# Altium footprint library myPcb.PcbLib: 145 footprints (part 4 of 10)
Each footprint in its own frame and in the unit in brackets; x right, y up, seen from the top. Pads: shape width x height; smd on the part's side, far side on the other; paste and mask are expansions set on the pad; w line width, h text height; cw(c..) or ccw(c..) is an arc to the next point about the centre after c.
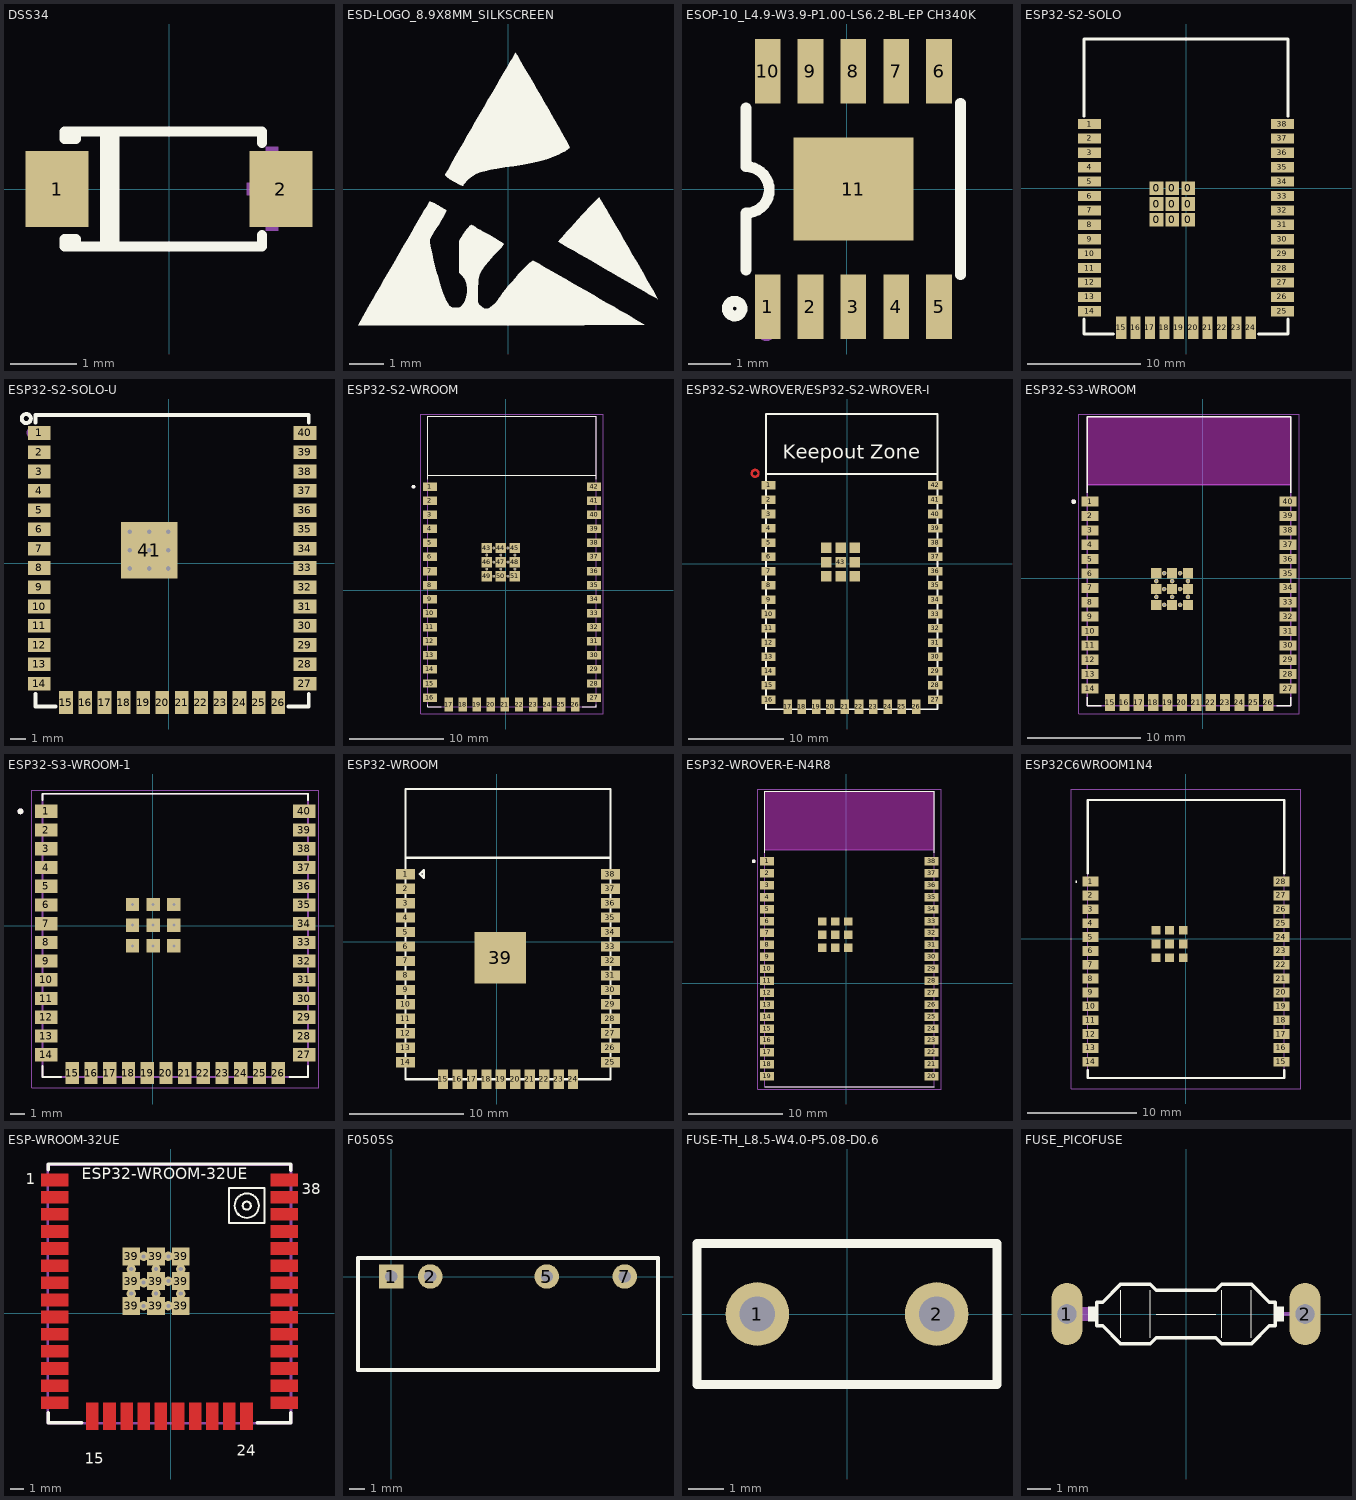
[diagram p3: the footprints below, top view; thin cyan lines are the x and y axes]

## DSS34 [mm]
pads (2):
  rect 0.95x1.15 smd paste+0 mask+0.051: 1(-1.693,0) 2(1.693,0)
Top Overlay:
  lines w0.152: -0.97,-0.866 -0.97,0.866 ; -0.827,-0.866 -0.827,0.866 ; 1.406,-0.698 1.406,-0.866 -1.406,-0.866 ; 1.406,0.698 1.406,0.866 -1.406,0.866 ; -1.406,-0.866 -1.58,-0.866 -1.58,-0.755 -1.406,-0.755 -1.406,-0.866 ; -1.406,0.866 -1.58,0.866 -1.58,0.755 -1.406,0.755 -1.406,0.866
Mechanical 15:
  region: -2.03,0.095 -2.03,-0.095 -1.272,-0.095 -1.272,0.095
  region: 1.935,0.098 1.935,-0.092 1.177,-0.092 1.177,0.098
  region: 1.651,0.635 1.651,-0.629 1.461,-0.629 1.461,0.635

## ESD-LOGO_8.9X8MM_SILKSCREEN [mm]
Top Overlay:
  drawing of 3 lines, arcs and shapes, not listed

## ESOP-10_L4.9-W3.9-P1.00-LS6.2-BL-EP CH340K [mm] "CH340K"
pads (11):
  rect 0.6x1.5 smd paste+0 mask+0.051: 1(-1.843,-2.75) 2(-0.843,-2.75) 3(0.157,-2.75) 4(1.157,-2.75) 5(2.157,-2.75) 6(2.157,2.75) 7(1.157,2.75) 8(0.157,2.75) 9(-0.843,2.75) 10(-1.843,2.75)
  rect 2.8x2.4 smd paste+0 mask+0.051: 11(0.157,0)
Top Overlay:
  circle w0.254: c-2.613,-2.79 r0.171
  lines w0.254: -2.343,-1.887 -2.343,-0.564 ; -2.343,-0.563 ccw(c-2.347,-0.021) -2.343,0.52 -2.343,1.887 ; 2.657,-2 2.657,2
Mechanical 15:
  circle w0.2: c-1.873,-3.35 r0.1

## ESP32-S2-SOLO [mm]
pads (47):
  rect 1.2x1.2 smd paste+0 mask+0.051: 0(-2.6,-2.789) 0(-2.6,-1.389) 0(-2.6,0.011) 0(-1.2,-2.789) 0(-1.2,-1.389) 0(-1.2,0.011) 0(0.2,-2.789) 0(0.2,-1.389) 0(0.2,0.011)
  rect 2x0.9 smd paste+0 mask+0.051: 1(-8.5,5.666) 2(-8.5,4.396) 3(-8.5,3.126) 4(-8.5,1.856) 5(-8.5,0.586) 6(-8.5,-0.684) 7(-8.5,-1.954) 8(-8.5,-3.224) 9(-8.5,-4.494) 10(-8.5,-5.764) 11(-8.5,-7.034) 12(-8.5,-8.304) 13(-8.5,-9.574) 14(-8.5,-10.844) 25(8.5,-10.844) 26(8.5,-9.574) 27(8.5,-8.304) 28(8.5,-7.034) 29(8.5,-5.764) 30(8.5,-4.494) 31(8.5,-3.224) 32(8.5,-1.954) 33(8.5,-0.684) 34(8.5,0.586) 35(8.5,1.856) 36(8.5,3.126) 37(8.5,4.396) 38(8.5,5.666)
  rect 0.9x2 smd paste+0 mask+0.051: 15(-5.715,-12.289) 16(-4.445,-12.289) 17(-3.175,-12.289) 18(-1.905,-12.289) 19(-0.635,-12.289) 20(0.635,-12.289) 21(1.905,-12.289) 22(3.175,-12.289) 23(4.445,-12.289) 24(5.715,-12.289)
Top Overlay:
  lines w0.254: -9,-11.525 -9,-12.838 -6.395,-12.838 ; -9,6.348 -9,13.162 9,13.162 9,6.348 ; 6.396,-12.838 9,-12.838 9,-11.525
Mechanical 15:
  text "Keepout Zone" at -8.687,8.458 h1.52

## ESP32-S2-SOLO-U [mm]
pads (41):
  rect 1.5x0.9 smd paste+0 mask+0.05: 1(-8.55,8.597) 2(-8.55,7.327) 3(-8.55,6.057) 4(-8.55,4.787) 5(-8.55,3.517) 6(-8.55,2.247) 7(-8.55,0.977) 8(-8.55,-0.293) 9(-8.55,-1.563) 10(-8.55,-2.833) 11(-8.55,-4.103) 12(-8.55,-5.373) 13(-8.55,-6.643) 14(-8.55,-7.913) 27(8.95,-7.913) 28(8.95,-6.643) 29(8.95,-5.373) 30(8.95,-4.103) 31(8.95,-2.833) 32(8.95,-1.563) 33(8.95,-0.293) 34(8.95,0.977) 35(8.95,2.247) 36(8.95,3.517) 37(8.95,4.787) 38(8.95,6.057) 39(8.95,7.327) 40(8.95,8.597)
  rect 0.9x1.5 smd paste+0 mask+0.05: 15(-6.785,-9.163) 16(-5.515,-9.163) 17(-4.245,-9.163) 18(-2.975,-9.163) 19(-1.705,-9.163) 20(-0.435,-9.163) 21(0.835,-9.163) 22(2.105,-9.163) 23(3.375,-9.163) 24(4.645,-9.163) 25(5.915,-9.163) 26(7.185,-9.163)
  rect 3.7x3.7 smd paste+0 mask+0.05: 41(-1.3,0.877)
via -0.037,2.08 diameter 0.61 hole 0.305
via -1.307,2.08 diameter 0.61 hole 0.305
via -2.577,2.08 diameter 0.61 hole 0.305
via -0.037,0.874 diameter 0.61 hole 0.305
via -1.307,0.874 diameter 0.61 hole 0.305
via -2.577,0.874 diameter 0.61 hole 0.305
via -0.037,-0.333 diameter 0.61 hole 0.305
via -1.307,-0.333 diameter 0.61 hole 0.305
via -2.577,-0.333 diameter 0.61 hole 0.305
Top Overlay:
  circle w0.254: c-9.4,9.546 r0.3
  lines w0.254: -8.8,-8.595 -8.8,-9.414 -7.466,-9.414 ; -8.8,9.277 -8.8,9.786 9.17,9.786 ; 7.867,-9.414 9.2,-9.414 9.2,-8.595 ; 9.2,9.277 9.2,9.786
Mechanical 15:
  circle w0.4: c-8.98,8.606 r0.2

## ESP32-S2-WROOM [mm]
pads (63):
  rect 1.5x0.9 smd: 1(-8.069,11.074) 2(-8.069,9.574) 3(-8.069,8.074) 4(-8.069,6.574) 5(-8.069,5.074) 6(-8.069,3.574) 7(-8.069,2.074) 8(-8.069,0.574) 9(-8.069,-0.926) 10(-8.069,-2.426) 11(-8.069,-3.926) 12(-8.069,-5.426) 13(-8.069,-6.926) 14(-8.069,-8.426) 15(-8.069,-9.926) 16(-8.069,-11.426) 27(9.431,-11.426) 28(9.431,-9.926) 29(9.431,-8.426) 30(9.431,-6.926) 31(9.431,-5.426) 32(9.431,-3.926) 33(9.431,-2.426) 34(9.431,-0.926) 35(9.431,0.574) 36(9.431,2.074) 37(9.431,3.574) 38(9.431,5.074) 39(9.431,6.574) 40(9.431,8.074) 41(9.431,9.574) 42(9.431,11.074)
  rect 0.9x1.5 smd: 17(-6.069,-12.176) 18(-4.569,-12.176) 19(-3.069,-12.176) 20(-1.569,-12.176) 21(-0.069,-12.176) 22(1.431,-12.176) 23(2.931,-12.176) 24(4.431,-12.176) 25(5.931,-12.176) 26(7.431,-12.176)
  rect 1.1x1.1 smd: 43(-2.009,4.524) 44(-0.509,4.524) 45(0.991,4.524) 46(-2.009,3.024) 47(-0.509,3.024) 48(0.991,3.024) 49(-2.009,1.524) 50(-0.509,1.524) 51(0.991,1.524)
  round 0.3 hole 0.2 mask+0: 52(-1.259,4.524) 53(0.241,4.524) 54(-2.009,3.774) 55(-0.509,3.774) 56(0.991,3.774) 57(-1.259,3.024) 58(0.241,3.024) 59(-2.009,2.274) 60(-0.509,2.274) 61(0.991,2.274) 62(-1.259,1.524) 63(0.241,1.524)
Top Overlay:
  circle w0.2: c-9.819,11.074 r0.1
  lines w0.127: -8.319,-12.196 -8.319,-12.426 -6.839,-12.426 ; -8.319,11.844 -8.319,12.274 ; 8.201,-12.426 9.681,-12.426 9.681,-12.196 ; 9.681,11.844 9.681,12.274 ; -8.319,12.274 9.681,12.274 ; -8.319,12.274 -8.319,18.574 9.681,18.574 9.681,12.274
Mechanical 13:
  circle w0.2: c-9.819,11.074 r0.1
  lines w0.127: -8.319,12.274 9.681,12.274 ; -8.319,12.274 -8.319,-12.426 9.681,-12.426 9.681,12.274 ; -8.319,12.274 -8.319,18.574 9.681,18.574 9.681,12.274
Mechanical 15:
  lines w0.05: -9.069,-13.176 10.431,-13.176 10.431,18.824 -9.069,18.824 -9.069,-13.176
3D body "step_temp.STEP": height 3.45, standoff 0, extent -8.319,-12.426 9.681,18.574

## ESP32-S2-WROVER/ESP32-S2-WROVER-I [mm]
pads (51):
  rect 1.5x0.9 smd paste+0 mask+0.051: 1(-8.24,8.2) 2(-8.24,6.7) 3(-8.24,5.2) 4(-8.24,3.7) 5(-8.24,2.2) 6(-8.24,0.7) 7(-8.24,-0.8) 8(-8.24,-2.3) 9(-8.24,-3.8) 10(-8.24,-5.3) 11(-8.24,-6.8) 12(-8.24,-8.3) 13(-8.24,-9.8) 14(-8.24,-11.3) 15(-8.24,-12.8) 16(-8.24,-14.3) 27(9.26,-14.3) 28(9.26,-12.8) 29(9.26,-11.3) 30(9.26,-9.8) 31(9.26,-8.3) 32(9.26,-6.8) 33(9.26,-5.3) 34(9.26,-3.8) 35(9.26,-2.3) 36(9.26,-0.8) 37(9.26,0.7) 38(9.26,2.2) 39(9.26,3.7) 40(9.26,5.2) 41(9.26,6.7) 42(9.26,8.2)
  rect 0.9x1.5 smd paste+0 mask+0.051: 17(-6.24,-15.05) 18(-4.74,-15.05) 19(-3.241,-15.05) 20(-1.74,-15.05) 21(-0.241,-15.05) 22(1.26,-15.05) 23(2.759,-15.05) 24(4.26,-15.05) 25(5.759,-15.05) 26(7.26,-15.05)
  rect 1.1x1.1 smd paste+0 mask+0.051: 43(-0.68,0.15) GND(-2.181,-1.35) GND(-2.181,0.15) GND(-2.181,1.65) GND(-0.68,-1.35) GND(-0.68,1.65) GND(0.82,-1.35) GND(0.82,0.15) GND(0.82,1.65)
Top Layer:
  circle w0.254: c-9.65,9.471 r0.359
Top Overlay:
  lines w0.2: -8.49,15.7 9.51,15.7 ; -8.49,15.7 -8.49,-15.3 9.51,-15.3 9.51,15.7 ; -8.49,15.7 9.51,15.7 ; -8.49,15.7 -8.49,9.4 9.51,9.4 9.51,15.7
  text "Keepout Zone" at -6.729,11.007 h1.5

## ESP32-S3-WROOM [mm]
pads (61):
  rect 1.5x0.9 smd: 1(-9.956,6.779) 2(-9.956,5.509) 3(-9.956,4.239) 4(-9.956,2.969) 5(-9.956,1.699) 6(-9.956,0.429) 7(-9.956,-0.841) 8(-9.956,-2.111) 9(-9.956,-3.381) 10(-9.956,-4.651) 11(-9.956,-5.921) 12(-9.956,-7.191) 13(-9.956,-8.461) 14(-9.956,-9.731) 27(7.544,-9.731) 28(7.544,-8.461) 29(7.544,-7.191) 30(7.544,-5.921) 31(7.544,-4.651) 32(7.544,-3.381) 33(7.544,-2.111) 34(7.544,-0.841) 35(7.544,0.429) 36(7.544,1.699) 37(7.544,2.969) 38(7.544,4.239) 39(7.544,5.509) 40(7.544,6.779)
  rect 0.9x1.5 smd: 15(-8.191,-10.981) 16(-6.921,-10.981) 17(-5.651,-10.981) 18(-4.381,-10.981) 19(-3.111,-10.981) 20(-1.841,-10.981) 21(-0.571,-10.981) 22(0.699,-10.981) 23(1.969,-10.981) 24(3.239,-10.981) 25(4.509,-10.981) 26(5.779,-10.981)
  rect 0.9x0.9 smd: 41_1(-2.706,-0.941) 41_2(-4.106,-0.941) 41_3(-1.306,-0.941) 41_4(-4.106,-2.341) 41_5(-2.706,-2.341) 41_6(-1.306,-2.341) 41_7(-4.106,0.459) 41_8(-2.706,0.459) 41_9(-1.306,0.459)
  round 0.4 hole 0.2 mask+0: 41_10(-2.706,-0.241) 41_11(-4.106,-0.241) 41_12(-1.306,-0.241) 41_13(-4.106,-1.641) 41_14(-2.706,-1.641) 41_15(-1.306,-1.641) 41_16(-3.406,0.459) 41_17(-2.006,0.459) 41_18(-3.406,-0.941) 41_19(-2.006,-0.941) 41_20(-3.406,-2.341) 41_21(-2.006,-2.341)
Top Overlay:
  circle w0.2: c-11.406,6.779 r0.1
  lines w0.127: -10.206,-10.501 -10.206,-11.231 -8.961,-11.231 ; -10.206,7.549 -10.206,14.269 7.794,14.269 7.794,7.549 ; 6.549,-11.231 7.794,-11.231 7.794,-10.501
Keep-Out Layer:
  region: 7.794,8.269 -10.206,8.269 -10.206,14.269 7.794,14.269
  region: 7.794,8.269 -10.206,8.269 -10.206,14.269 7.794,14.269
Mechanical 13:
  circle w0.2: c-11.406,6.779 r0.1
  lines w0.127: -10.206,8.269 7.794,8.269 ; -10.206,8.269 -10.206,14.269 7.794,14.269 7.794,8.269 ; -10.206,8.269 -10.206,-11.231 7.794,-11.231 7.794,8.269
  text "ANTENNA" at -5.706,11.019 h1.27
Mechanical 15:
  lines w0.05: -10.956,-11.981 8.544,-11.981 8.544,14.519 -10.956,14.519 -10.956,-11.981
3D body "step_temp.STEP": height 3.25, standoff 0, extent -10.206,-11.231 7.794,14.269

## ESP32-S3-WROOM-1 [mm] "不带天线"
pads (58):
  rect 1.5x0.9 smd: 1(-7.226,7.775) 2(-7.226,6.505) 3(-7.226,5.235) 4(-7.226,3.965) 5(-7.226,2.695) 6(-7.226,1.425) 7(-7.226,0.155) 8(-7.226,-1.115) 9(-7.226,-2.385) 10(-7.226,-3.655) 11(-7.226,-4.925) 12(-7.226,-6.195) 13(-7.226,-7.465) 14(-7.226,-8.735) 27(10.274,-8.735) 28(10.274,-7.465) 29(10.274,-6.195) 30(10.274,-4.925) 31(10.274,-3.655) 32(10.274,-2.385) 33(10.274,-1.115) 34(10.274,0.155) 35(10.274,1.425) 36(10.274,2.695) 37(10.274,3.965) 38(10.274,5.235) 39(10.274,6.505) 40(10.274,7.775)
  rect 0.9x1.5 smd: 15(-5.461,-9.985) 16(-4.191,-9.985) 17(-2.921,-9.985) 18(-1.651,-9.985) 19(-0.381,-9.985) 20(0.889,-9.985) 21(2.159,-9.985) 22(3.429,-9.985) 23(4.699,-9.985) 24(5.969,-9.985) 25(7.239,-9.985) 26(8.509,-9.985)
  rect 0.9x0.9 smd: 41_1(-1.376,1.455) 41_2(0.024,1.455) 41_3(1.424,1.455) 41_4(-1.376,0.055) 41_5(0.024,0.055) 41_6(1.424,0.055) 41_7(-1.376,-1.345) 41_8(0.024,-1.345) 41_9(1.424,-1.345)
  round 0.4 hole 0.2 mask+0: 41_10(-1.376,1.455) 41_11(0.024,1.455) 41_12(-1.376,0.055) 41_13(0.024,0.055) 41_14(1.424,1.455) 41_16(1.424,0.055) 41_17(-1.376,-1.345) 41_18(0.024,-1.345) 41_19(1.424,-1.345)
Top Overlay:
  circle w0.2: c-8.976,7.775 r0.1
  lines w0.127: -7.476,-9.505 -7.476,-10.235 -6.231,-10.235 ; -7.476,8.545 -7.476,8.965 10.524,8.965 10.524,8.545 ; 9.279,-10.235 10.524,-10.235 10.524,-9.505
Mechanical 13:
  circle w0.2: c-8.976,7.775 r0.1
  lines w0.127: -7.476,-10.235 -7.476,8.965 10.524,8.965 10.524,-10.235 -7.476,-10.235
Mechanical 15:
  lines w0.05: -8.226,-10.985 11.274,-10.985 11.274,9.215 -8.226,9.215 -8.226,-10.985

## ESP32-WROOM [mm]
pads (39):
  rect 1.7x0.9 smd: 1(-8.009,5.937) 2(-8.009,4.667) 3(-8.009,3.397) 4(-8.009,2.127) 5(-8.009,0.857) 6(-8.009,-0.413) 7(-8.009,-1.683) 8(-8.009,-2.953) 9(-8.009,-4.223) 10(-8.009,-5.493) 11(-8.009,-6.763) 12(-8.009,-8.033) 13(-8.009,-9.303) 14(-8.009,-10.573) 25(9.991,-10.573) 26(9.991,-9.303) 27(9.991,-8.033) 28(9.991,-6.763) 29(9.991,-5.493) 30(9.991,-4.223) 31(9.991,-2.953) 32(9.991,-1.683) 33(9.991,-0.413) 34(9.991,0.857) 35(9.991,2.127) 36(9.991,3.397) 37(9.991,4.667) 38(9.991,5.937)
  rect 0.9x1.7 smd: 15(-4.719,-12.083) 16(-3.449,-12.083) 17(-2.179,-12.083) 18(-0.909,-12.083) 19(0.361,-12.083) 20(1.631,-12.083) 21(2.901,-12.083) 22(4.171,-12.083) 23(5.441,-12.083) 24(6.711,-12.083)
  rect 4.5x4.5 smd: 39(0.311,-1.403)
Top Overlay:
  lines w0.2: -8.009,7.377 9.991,7.377 ; -8.009,-12.073 9.991,-12.073 9.991,13.427 -8.009,13.427 -8.009,-12.073 ; -6.759,5.957 -6.409,6.307 -6.409,5.607 -6.759,5.957

## ESP32-WROVER-E-N4R8 [mm] "ESP32Wrover"
pads (47):
  rect 1.5x0.9 smd: 1(-8.389,12.941) 2(-8.389,11.671) 3(-8.389,10.401) 4(-8.389,9.131) 5(-8.389,7.861) 6(-8.389,6.591) 7(-8.389,5.321) 8(-8.389,4.051) 9(-8.389,2.781) 10(-8.389,1.511) 11(-8.389,0.241) 12(-8.389,-1.029) 13(-8.389,-2.299) 14(-8.389,-3.569) 15(-8.389,-4.839) 16(-8.389,-6.109) 17(-8.389,-7.379) 18(-8.389,-8.649) 19(-8.389,-9.919) 20(9.111,-9.919) 21(9.111,-8.649) 22(9.111,-7.379) 23(9.111,-6.109) 24(9.111,-4.839) 25(9.111,-3.569) 26(9.111,-2.299) 27(9.111,-1.029) 28(9.111,0.241) 29(9.111,1.511) 30(9.111,2.781) 31(9.111,4.051) 32(9.111,5.321) 33(9.111,6.591) 34(9.111,7.861) 35(9.111,9.131) 36(9.111,10.401) 37(9.111,11.671) 38(9.111,12.941)
  rect 0.9x0.9 smd: 39_1(-2.539,6.541) 39_2(-1.139,6.541) 39_3(0.261,6.541) 39_4(-2.539,5.141) 39_5(-1.139,5.141) 39_6(0.261,5.141) 39_7(-2.539,3.741) 39_8(-1.139,3.741) 39_9(0.261,3.741)
Top Overlay:
  circle w0.2: c-9.799,12.941 r0.1
  lines w0.127: -8.639,-11.019 9.361,-11.019 ; -8.639,13.831 -8.639,20.381 9.361,20.381 9.361,13.831
Keep-Out Layer:
  region: 9.361,14.161 -8.639,14.161 -8.639,20.381 9.361,20.381
Mechanical 13:
  circle w0.2: c-9.799,12.941 r0.1
  lines w0.127: -8.639,14.161 9.361,14.161 ; -8.639,14.161 -8.639,-11.019 9.361,-11.019 9.361,14.161 ; -8.639,14.161 -8.639,20.381 9.361,20.381 9.361,14.161
Mechanical 15:
  lines w0.05: -9.389,-11.269 -9.389,20.631 10.111,20.631 10.111,-11.269 -9.389,-11.269

## ESP32C6WROOM1N4 [mil]
pads (37):
  rect 59.05x35.43 smd paste+0 mask+2: 1(-344.49,207.09) 2(-344.49,157.09) 3(-344.49,107.09) 4(-344.49,57.09) 5(-344.49,7.09) 6(-344.49,-42.91) 7(-344.49,-92.91) 8(-344.49,-142.91) 9(-344.49,-192.91) 10(-344.49,-242.91) 11(-344.49,-292.91) 12(-344.49,-342.91) 13(-344.49,-392.91) 14(-344.49,-442.91) 15(344.49,-442.91) 16(344.49,-392.91) 17(344.49,-342.91) 18(344.49,-292.91) 19(344.49,-242.91) 20(344.49,-192.91) 21(344.49,-142.91) 22(344.49,-92.91) 23(344.49,-42.91) 24(344.49,7.09) 25(344.49,57.09) 26(344.49,107.09) 27(344.49,157.09) 28(344.49,207.09)
  rect 31.5x31.5 smd paste+0 mask+2: 29(-59.25,-18.11) 30(-59.25,31.1) 31(-108.46,31.1) 32(-108.46,-18.11) 33(-108.46,-67.32) 34(-59.25,-67.32) 35(-10.04,-67.32) 36(-10.04,-18.11) 37(-10.04,31.1)
Top Overlay:
  lines w3.94: -397.64,207.09 ccw(c-395.67,207.09) -393.7,207.09 ccw(c-395.67,207.09) -397.64,207.09
  lines w7.87: -354.33,-472.44 -354.33,-501.97 354.33,-501.97 354.33,-472.44 ; -354.33,236.22 -354.33,501.97 354.33,501.97 354.33,236.22
Mechanical 15:
  lines w3.94: -413.39,-541.34 -413.39,541.34 413.39,541.34 413.39,-541.34 -413.39,-541.34 ; -354.33,-501.97 -354.33,501.97 354.33,501.97 354.33,-501.97 -354.33,-501.97

## ESP-WROOM-32UE [mm]
pads (9):
  rect 1.33x1.33 smd paste+0 mask+0.051: 39(-2.935,0.534) 39(-2.935,2.369) 39(-2.935,4.204) 39(-1.1,0.534) 39(-1.1,2.369) 39(-1.1,4.204) 39(0.735,0.534) 39(0.735,2.369) 39(0.735,4.204)
via -0.183,0.534 diameter 0.7 hole 0.3
via 0.735,1.452 diameter 0.7 hole 0.3
via 0.735,3.269 diameter 0.7 hole 0.3
via -2.935,3.269 diameter 0.7 hole 0.3
via -2.935,1.452 diameter 0.7 hole 0.3
via -2.017,0.534 diameter 0.7 hole 0.3
via -2.017,4.204 diameter 0.7 hole 0.3
via -2.017,2.269 diameter 0.7 hole 0.3
via -0.183,2.369 diameter 0.7 hole 0.3
via -1.1,1.452 diameter 0.7 hole 0.3
via -1.1,3.269 diameter 0.7 hole 0.3
via -0.183,4.204 diameter 0.7 hole 0.3
Top Layer:
  region: 6.065,-8.641 5.165,-8.641 5.165,-6.641 6.065,-6.641
  region: 4.795,-8.641 3.895,-8.641 3.895,-6.641 4.795,-6.641
  region: 3.525,-8.641 2.625,-8.641 2.625,-6.641 3.525,-6.641
  region: 2.255,-8.641 1.355,-8.641 1.355,-6.641 2.255,-6.641
  region: 0.985,-8.641 0.085,-8.641 0.085,-6.641 0.985,-6.641
  region: -0.285,-6.641 -0.285,-8.641 -1.185,-8.641 -1.185,-6.641
  region: -1.555,-6.641 -1.555,-8.641 -2.455,-8.641 -2.455,-6.641
  region: -2.825,-6.641 -2.825,-8.641 -3.725,-8.641 -3.725,-6.641
  region: -4.095,-6.641 -4.095,-8.641 -4.995,-8.641 -4.995,-6.641
  region: -5.365,-6.641 -5.365,-8.641 -6.265,-8.641 -6.265,-6.641
  region: 9.4,-7.091 7.4,-7.091 7.4,-6.191 9.4,-6.191
  region: 9.4,-5.821 7.4,-5.821 7.4,-4.921 9.4,-4.921
  region: 9.4,-4.551 7.4,-4.551 7.4,-3.651 9.4,-3.651
  region: 9.4,-3.281 7.4,-3.281 7.4,-2.381 9.4,-2.381
  region: 9.4,-2.011 7.4,-2.011 7.4,-1.111 9.4,-1.111
  region: 9.4,-0.741 7.4,-0.741 7.4,0.159 9.4,0.159
  region: 9.4,0.529 7.4,0.529 7.4,1.429 9.4,1.429
  region: 9.4,1.799 7.4,1.799 7.4,2.699 9.4,2.699
  region: 9.4,3.069 7.4,3.069 7.4,3.969 9.4,3.969
  region: 9.4,4.339 7.4,4.339 7.4,5.239 9.4,5.239
  region: 9.4,5.609 7.4,5.609 7.4,6.509 9.4,6.509
  region: 9.4,6.879 7.4,6.879 7.4,7.779 9.4,7.779
  region: 9.4,8.149 7.4,8.149 7.4,9.049 9.4,9.049
  region: 9.4,9.419 7.4,9.419 7.4,10.319 9.4,10.319
  region: -7.6,-7.091 -9.6,-7.091 -9.6,-6.191 -7.6,-6.191
  region: -7.6,-5.821 -9.6,-5.821 -9.6,-4.921 -7.6,-4.921
  region: -7.6,-4.551 -9.6,-4.551 -9.6,-3.651 -7.6,-3.651
  region: -7.6,-3.281 -9.6,-3.281 -9.6,-2.381 -7.6,-2.381
  region: -7.6,-2.011 -9.6,-2.011 -9.6,-1.111 -7.6,-1.111
  region: -7.6,-0.741 -9.6,-0.741 -9.6,0.159 -7.6,0.159
  region: -7.6,0.529 -9.6,0.529 -9.6,1.429 -7.6,1.429
  region: -7.6,1.799 -9.6,1.799 -9.6,2.699 -7.6,2.699
  region: -7.6,3.069 -9.6,3.069 -9.6,3.969 -7.6,3.969
  region: -7.6,4.339 -9.6,4.339 -9.6,5.239 -7.6,5.239
  region: -7.6,5.609 -9.6,5.609 -9.6,6.509 -7.6,6.509
  region: -7.6,6.879 -9.6,6.879 -9.6,7.779 -7.6,7.779
  region: -7.6,8.149 -9.6,8.149 -9.6,9.049 -7.6,9.049
  region: -7.6,9.419 -9.6,9.419 -9.6,10.319 -7.6,10.319
Top Overlay:
  lines w0.15: 4.73,7.964 ccw(c5.63,7.969) 4.73,7.969 ; 5.33,7.962 ccw(c5.63,7.969) 5.33,7.969 ; 4.3,6.669 6.93,6.669 6.93,9.269 4.3,9.269 4.3,6.669
  lines w0.254: -9.1,-7.391 -9.1,-8.141 -6.6,-8.141 ; -9.1,10.614 -9.1,11.014 ; -9.1,11.059 8.9,11.059 ; 6.4,-8.141 8.9,-8.141 8.9,-7.391 ; 8.9,10.609 8.9,11.014
  text "ESP32-WROOM-32UE" at -6.591,9.919 h0.83
  text "38" at 9.7,8.814 h0.8
  text "24" at 4.9,-10.586 h0.8
  text "15" at -6.4,-11.186 h0.8
  text "1" at -10.772,9.548 h0.8
Mechanical 1:
  lines w0.2: -9.117,-8.157 8.917,-8.157 8.917,11.02 -9.117,11.02 -9.117,-8.157

## F0505S [mm]
pads (4):
  rect 1.6x1.6 / inner round 1.6 / far side rect 1.6x1.6 hole 0.8: 1(0,0)
  round 1.6 hole 0.8: 2(2.54,0) 5(10.16,0) 7(15.24,0)
Top Overlay:
  lines w0.254: -2.18,-6.1 -2.18,1.2 17.42,1.2 17.42,-6.1 -2.18,-6.1
Top Assembly:
  lines w0.254: -2.18,-6.1 -2.18,1.2 17.42,1.2 17.42,-6.1 -2.18,-6.1
  text "U38" at 5.178,-3.436 h1.27

## FUSE-TH_L8.5-W4.0-P5.08-D0.6 [mm] "Fuse 1.25A 275V"
pads (2):
  round 1.8 hole 1 paste+0 mask+0.051: 1(-2.54,0) 2(2.54,0)
Top Overlay:
  lines w0.254: -4.25,-2 -4.25,2 4.25,2 4.25,-2 -4.25,-2

## FUSE_PICOFUSE [mil]
pads (2):
  oval 52x104 hole 32 slot 32.2 at 90 deg paste+0 mask+2: 1(-200,0) 2(200,0)
Top Overlay:
  region: -164,-12 -150,-12 -150,12 -164,12
  region: 150,-12 164,-12 164,12 150,12
  lines w2: -110,-40 -110,40 ; -60,-40 -60,40 ; -50,0 50,0 ; 60,-40 60,40 ; 110,-40 110,40
  lines w6: -150,-20 -150,20 -140,20 -110,50 -60,50 -50,40 50,40 60,50 110,50 140,20 150,20 150,-20 140,-20 110,-50 60,-50 50,-40 -50,-40 -60,-50 -110,-50 -140,-20 -150,-20
Mechanical 15:
  lines w6: 160,0 200,0
  lines w24: -200,0 -160,0